# Altium footprint library DrPCB.PcbLib: 910 footprints (part 47 of 57)
Each footprint in its own frame and in the unit in brackets; x right, y up, seen from the top. Pads: shape width x height; smd on the part's side, far side on the other; paste and mask are expansions set on the pad; w line width, h text height; cw(c..) or ccw(c..) is an arc to the next point about the centre after c.
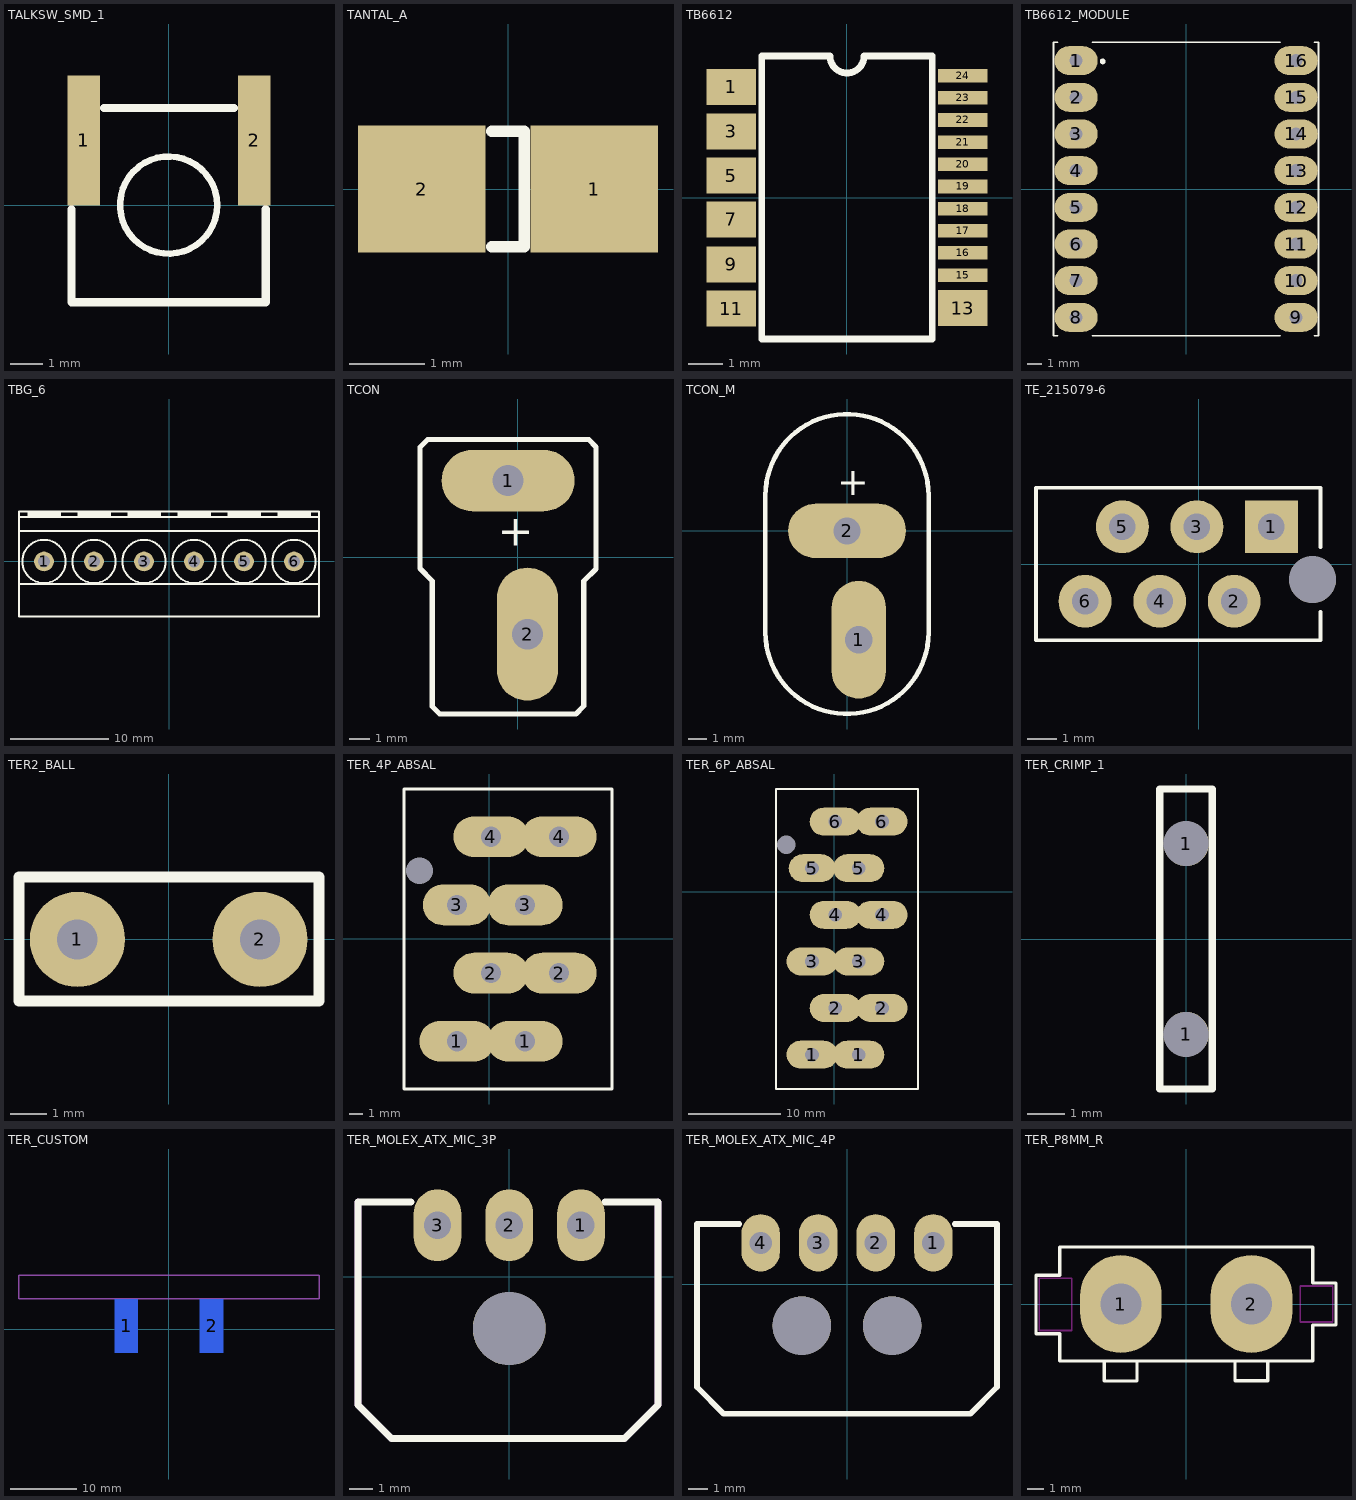
[diagram p46: the footprints below, top view; thin cyan lines are the x and y axes]

## TALKSW_SMD_1 [mm]
pads (2):
  rect 1x4 smd: 1(-2.616,1.994) 2(2.642,1.994)
Top Overlay:
  circle w0.2: c0,0 r1.5
  lines w0.254: -3,-0.127 -3,-3 3,-3 3,-0.127 ; -1.994,3 2.019,3

## TANTAL_A [mm]
pads (2):
  rect 1.7x1.7 smd: 1(1.15,0.006) 2(-1.15,0.006)
Top Overlay:
  lines w0.15: -0.216,-0.762 0.216,-0.762 0.216,0.775 -0.216,0.775
3D body "User Library-Tantalum Capacitor Case A.STEP": height 1.66, standoff 0.01, extent -1.695,-0.794 1.695,0.806

## TB6612 [mm]
pads (17):
  rect 1.45x1.06 smd: 1(-3.4,3.245) 3(-3.4,1.937) 5(-3.4,0.642) 7(-3.4,-0.641) 9(-3.4,-1.962) 11(-3.4,-3.257) 13(3.4,-3.245)
  rect 1.45x0.4 smd: 15(3.4,-2.275) 16(3.4,-1.625) 17(3.4,-0.975) 18(3.4,-0.325) 19(3.4,0.325) 20(3.4,0.975) 21(3.4,1.625) 22(3.4,2.275) 23(3.4,2.925) 24(3.4,3.575)
Top Overlay:
  lines w0.2: -2.5,-4.15 -2.5,4.15 -0.5,4.15 ccw(c0,4.15) 0.5,4.15 2.5,4.15 2.5,-4.15 -2.5,-4.15

## TB6612_MODULE [mm]
pads (16):
  oval 3x2 hole 0.9: 1(-7.62,8.89) 2(-7.62,6.35) 3(-7.62,3.81) 4(-7.62,1.27) 5(-7.62,-1.27) 6(-7.62,-3.81) 7(-7.62,-6.35) 8(-7.62,-8.89) 9(7.62,-8.89) 10(7.62,-6.35) 11(7.62,-3.81) 12(7.62,-1.27) 13(7.62,1.27) 14(7.62,3.81) 15(7.62,6.35) 16(7.62,8.89)
Top Overlay:
  circle w0.2: c-5.779,8.839 r0.1
  lines w0.127: -8.89,-10.16 -9.182,-10.16 -9.182,10.16 -8.89,10.16 ; -6.5,-10.16 6.5,-10.16 ; -6.5,10.16 6.5,10.16 ; 8.89,-10.16 9.169,-10.16 9.169,10.16 8.89,10.16
3D body "NOYITO Dual Motor Driver TB6612FNG.stp": height 14.68, standoff 2.92, extent -9.081,-10.414 9.08,10.414
3D body "female_header_a-bl254-eg-g03d.stp": height 8.5, standoff -3.2, extent -8.87,-2.678 -6.37,5.192
3D body "female_header_a-bl254-eg-g03d.stp": height 8.5, standoff -3.2, extent -8.87,-10.298 -6.37,-2.428
3D body "female_header_a-bl254-eg-g02d.stp": height 8.5, standoff -3.2, extent -8.87,4.942 -6.37,10.272
3D body "female_header_a-bl254-eg-g03d.stp": height 8.5, standoff -3.2, extent 6.37,-2.678 8.87,5.192
3D body "female_header_a-bl254-eg-g03d.stp": height 8.5, standoff -3.2, extent 6.37,-10.298 8.87,-2.428
3D body "female_header_a-bl254-eg-g02d.stp": height 8.5, standoff -3.2, extent 6.37,4.942 8.87,10.272

## TBG_6 [mm] "Terminal Block Green"
pads (6):
  round 2 / inner round 2 / far side oval 2.4x3 hole 1.2: 1(-12.7,0) 2(-7.62,0) 3(-2.54,0) 4(2.54,0) 5(7.62,0) 6(12.7,0)
Top Overlay:
  circle w0.2: c12.7,0 r2.2
  circle w0.2: c7.62,0 r2.2
  circle w0.2: c2.54,0 r2.2
  circle w0.2: c-2.54,0 r2.2
  circle w0.2: c-7.62,0 r2.2
  circle w0.2: c-12.7,0 r2.2
  rectangle: 11.04,4.5 14.44,5.08
  rectangle: 5.96,4.5 9.36,5.08
  rectangle: 0.88,4.5 4.28,5.08
  rectangle: -4.2,4.5 -0.8,5.08
  rectangle: -9.28,4.5 -5.88,5.08
  rectangle: -14.36,4.5 -10.96,5.08
  lines w0.2: -15.24,-2.27 15.2,-2.27 ; -15.24,3.07 15.2,3.07 ; -15.24,4.5 15.2,4.5 ; -15.24,-5.6 -15.24,5.08 15.24,5.08 15.24,-5.6 -15.24,-5.6
3D body "User Library-klema-5mm-3pin.step": height 14.1, standoff -3.9, extent -15.12,-5.5 -0.12,5
3D body "User Library-klema-5mm-3pin.step": height 14.1, standoff -3.9, extent 0.12,-5.5 15.12,5

## TCON [mm]
pads (2):
  oval 6.5x3 hole 1.5: 1(-0.475,3.75)
  oval 3x6.5 hole 1.5: 2(0.475,-3.75)
Top Overlay:
  lines w0.254: -4.78,-0.549 -4.175,-1.154 -4.175,-7.288 -3.813,-7.65 2.838,-7.65 3.225,-7.263 3.225,-1.154 3.818,-0.561 ; -4.775,-0.55 -4.775,5.375 -4.4,5.75 3.463,5.75 3.825,5.387 3.825,-0.55
  text "+" at -0.983,0.559 h1.52

## TCON_M [mm]
pads (2):
  oval 3x6.5 hole 1.5: 1(0.65,-6)
  oval 6.5x3 hole 1.5: 2(0,0)
Top Overlay:
  lines w0.254: -4.5,1.95 cw(c0,1.95) 4.5,1.95 ; -4.5,1.981 -4.5,-5.6 ccw(c0,-5.6) 4.5,-5.6 ; 4.5,-5.639 4.5,1.956
  text "+" at -0.533,1.956 h1.52

## TE_215079-6 [mm]
pads (7):
  rect 1.8x1.8 hole 0.9: 1(2.475,1.27)
  round 1.8 hole 0.9: 2(1.205,-1.27) 3(-0.065,1.27) 4(-1.335,-1.27) 5(-2.605,1.27) 6(-3.875,-1.27)
  round 1.6 hole 1.6 unplated: ""(3.875,-0.53)
Top Overlay:
  lines w0.127: 4.15,-1.63 4.15,-2.6 -5.55,-2.6 -5.55,2.6 4.15,2.6 4.15,0.57
3D body "User Library-MicroMatch_6_3.STEP": height 7.35, standoff -3, extent -6.2,-2.5 4.8,2.5

## TER2_BALL [mm]
pads (2):
  round 2.6 hole 1.1: 1(-2.498,0) 2(2.498,0)
Top Overlay:
  lines w0.3: -4.093,-1.69 -4.093,1.71 4.111,1.71 4.111,-1.69 -4.093,-1.69

## TER_4P_ABSAL [mil]
pads (9):
  oval 220x120 hole 59.05: 1(-95,-300) 1(105,-300) 2(205,-100) 3(105,100) 4(5,300) 4(205,300)
  oval 220x120 hole 59.06: 2(5,-100)
  oval 200x120 hole 59.05: 3(-95,100)
  round 65 hole 78.74: ""(-205,200)
Top Overlay:
  lines w10: -250,-440 360,-440 360,440 -250,440 -250,-440
3D body: height 519.68, standoff 0, extent -250,-440 360.5,441

## TER_6P_ABSAL [mil]
pads (13):
  oval 220x120 hole 59.05: 1(-95,-700) 1(105,-700) 2(205,-500) 3(-95,-300) 3(105,-300) 4(205,-100) 5(105,100) 6(5,300) 6(205,300)
  oval 220x120 hole 59.06: 2(5,-500) 4(5,-100)
  oval 200x120 hole 59.05: 5(-95,100)
  round 65 hole 78.74: ""(-205,200)
Top Overlay:
  lines w10: -250,-847.5 360,-847.5 360,440 -250,440 -250,-847.5
3D body: height 519.68, standoff 0, extent -252.48,-847.5 358.25,438.5

## TER_CRIMP_1 [mm]
pads (2):
  round 1.2 / inner oval 2x3 / far side oval 2x3 hole 1.2: 1(0,-2.54) 1(0,2.54)
Top Overlay:
  lines w0.2: -0.711,-4 0.699,-4 0.699,4 -0.711,4 -0.711,-4
3D body "197084013.stp": height 9.16, standoff -3.79, extent -0.432,-3.175 0.381,3.175

## TER_CUSTOM [mm]
pads (2):
  rect 3.5x8 smd far side: 1(-6.4,0.5) 2(6.4,0.5)
Mechanical 1:
  lines w0.2: -22.5,4.597 22.5,4.597 22.5,8.097 -22.5,8.097 -22.5,4.597

## TER_MOLEX_ATX_MIC_3P [mm]
pads (4):
  oval 2x3 hole 1.15: 1(3,2.16) 2(0,2.16) 3(-3,2.16)
  round 3.05 hole 3.05 unplated: ""(0,-2.16)
Top Overlay:
  lines w0.3: -4.925,-6.76 -6.325,-5.36 -6.325,3.14 -4.12,3.14 ; -4.924,-6.761 4.822,-6.761 6.222,-5.361 6.222,3.139 4.017,3.139
Mechanical 13:
  lines w0.3: -6.325,3.14 -6.325,-5.36 -4.925,-6.76 ; 4.822,-6.761 6.222,-5.361 6.222,3.139
3D body "436500300.stp": height 5.58, standoff -3.33, extent -6.325,-6.69 6.325,3.21

## TER_MOLEX_ATX_MIC_4P [mm]
pads (6):
  oval 2x3 hole 1.15: 1(4.5,2.16) 2(1.5,2.16) 3(-1.5,2.16) 4(-4.5,2.16)
  round 3.05 hole 3.05 unplated: ""(-2.35,-2.16) ""(2.35,-2.16)
Top Overlay:
  lines w0.3: -5.62,3.14 -7.825,3.14 -7.825,-5.36 -6.425,-6.76 6.425,-6.76 7.825,-5.36 7.825,3.14 5.62,3.14
Mechanical 13:
  lines w0.127: -7.825,3.14 -7.825,-5.36 -6.425,-6.76 6.425,-6.76 7.825,-5.36 7.825,3.14
3D body "436500400.stp": height 5.58, standoff -3.33, extent -7.825,-6.697 7.825,3.203

## TER_P8MM_R [mm]
pads (2):
  oval 5x6 hole 2.5: 1(-4,0) 2(4,0)
Top Overlay:
  lines w0.2: -7.75,-1.839 -7.75,-3.5 7.75,-3.5 7.75,-1.292 ; -7.75,-1.816 -9.207,-1.816 -9.207,1.765 -7.75,1.765 ; -7.75,1.839 -7.75,3.5 7.75,3.5 7.75,1.292 ; -5.018,-3.531 -5.018,-4.725 -3.018,-4.725 -3.018,-3.531 ; 2.992,-3.505 2.992,-4.7 4.992,-4.7 4.992,-3.505 ; 7.75,-1.283 9.182,-1.283 9.182,1.283 7.75,1.283
Keep-Out Layer:
  lines w0.1: -9.018,-1.625 -9.018,1.575 -7.018,1.575 -7.018,-1.625 -9.018,-1.625 ; 6.992,-1.1 6.992,1.1 8.992,1.1 8.992,-1.1 6.992,-1.1
3D body: height 0.25, standoff 0, extent 7.391,3.162 7.391,3.162
3D body: height 15.2, standoff 0, extent -7.747,-4.724 7.747,3.505